# Altium footprint library PCBLIB.PcbLib: 557 footprints (part 20 of 36)
Each footprint in its own frame and in the unit in brackets; x right, y up, seen from the top. Pads: shape width x height; smd on the part's side, far side on the other; paste and mask are expansions set on the pad; w line width, h text height; cw(c..) or ccw(c..) is an arc to the next point about the centre after c.
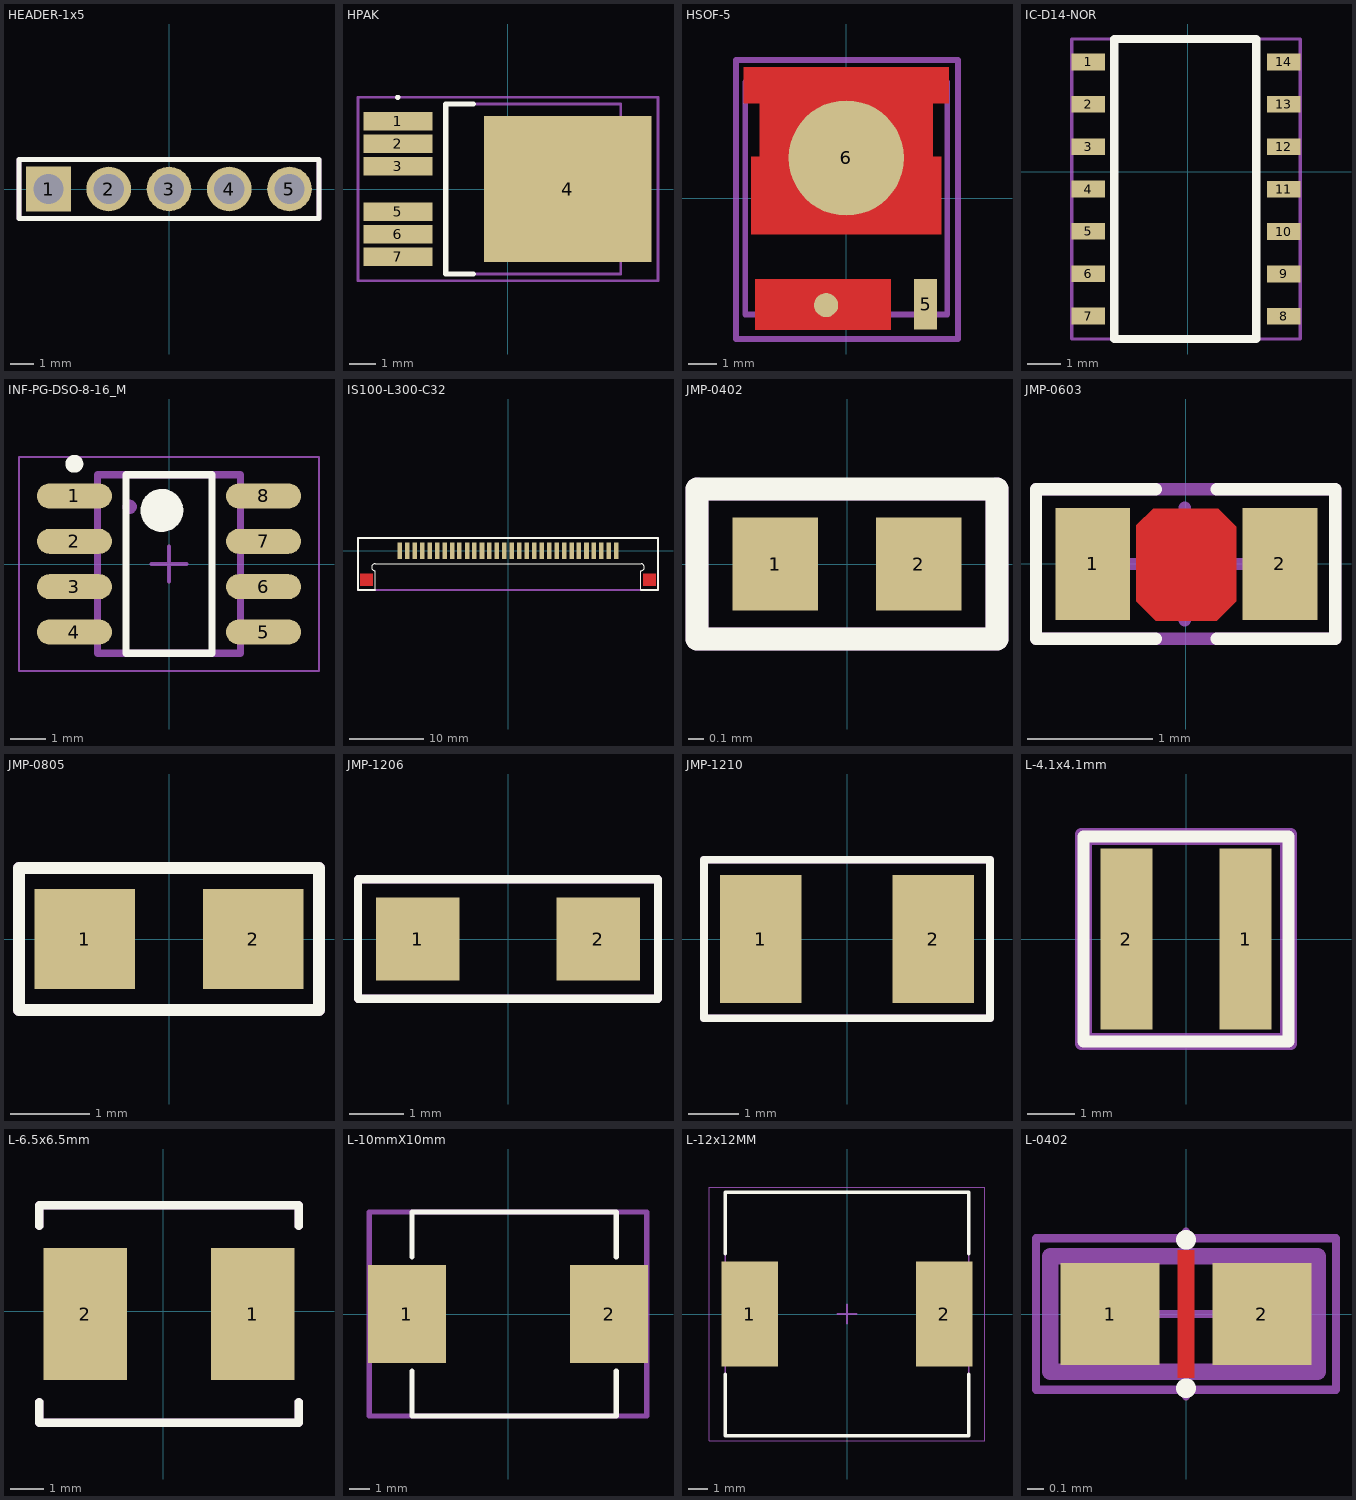
[diagram p19: the footprints below, top view; thin cyan lines are the x and y axes]

## HEADER-1x5 [mil]
pads (5):
  rect 74x74 hole 50 mask+2: 1(-200,0)
  round 74 hole 50 mask+2: 2(-100,0) 3(0,0) 4(100,0) 5(200,0)
Top Overlay:
  lines w8: -249,-49 -249,49 249,49 249,-49 -249,-49
ASM Top:
  lines w8: -249,-49 -249,49 249,49 249,-49 -249,-49
  text ".designator" at -74.8,-11.81 h31.5
3D body "Header_Male_5Pin.STEP": height 336.22, standoff -118.11, extent -250,-49 250,49.03

## HPAK [mm] "D-PAK, 7-Pads, Body 6.40x6.56mm (max), IPC Medium Density"
height 2.4
pads (7):
  rect 2.6x0.7 smd mask+0.05: 1(-4.15,2.55) 2(-4.15,1.7) 3(-4.15,0.85) 5(-4.15,-0.85) 6(-4.15,-1.7) 7(-4.15,-2.55)
  rect 6.3x5.5 smd mask+0.05: 4(2.25,0)
Top Overlay:
  circle w0.1: c-4.15,3.45 r0.05
  lines w0.2: -1.3,-3.2 -2.35,-3.2 -2.35,3.2 -1.3,3.2
Mechanical 15:
  lines w0.1: -0.5,0 0.5,0 ; 0,-0.5 0,0.5 ; -5.65,-3.45 5.65,-3.45 5.65,3.45 -5.65,3.45 -5.65,-3.45
ASM Top:
  lines w0.1: -2.35,-3.2 4.25,-3.2 4.25,3.2 -2.35,3.2 -2.35,-3.2
  text ".designator" at 0,0 h0.8
3D body "User Library-HPAK.step": height 2.41, standoff 0.01, extent -5.1,-3.3 4.7,3.3

## HSOF-5 [mm]
pads (3):
  round 0.837 smd paste-1000 mask+0: 1-2-3-4(-0.7,-3.7)
  rect 0.8x1.75 smd paste-0.05 mask+0: 5(2.75,-3.675)
  round 4 smd paste-1000 mask+0: 6(0,1.4)
Top Layer:
  region: -3.15,-2.81 1.55,-2.81 1.55,-4.55 -3.15,-4.55
  region: -3.55,4.55 3.55,4.55 3.55,3.3 3,3.3 3,1.45 3.3,1.45 3.3,-1.25 -3.3,-1.25 -3.3,1.45 -3,1.45 -3,3.3 -3.55,3.3
Top Paste:
  rectangle: 0.75,-4.5 1.45,-2.85
  rectangle: -0.55,-4.5 0.15,-2.85
  rectangle: -1.85,-4.5 -1.15,-2.85
  rectangle: -3.15,-4.5 -2.45,-2.85
  region: 3.2,-1.175 3.2,-0.175 0.2,-0.175 0.2,-1.175
  region: -0.2,-1.175 -0.2,-0.175 -3.2,-0.175 -3.2,-1.175
  region: 3.2,0.333 3.2,1.333 0.2,1.333 0.2,0.333
  region: -0.2,0.325 -0.2,1.325 -3.2,1.325 -3.2,0.325
  region: 2.9,1.9 2.9,2.9 0.2,2.9 0.2,1.9
  region: -0.2,1.9 -0.2,2.9 -2.9,2.9 -2.9,1.9
  region: -0.2,3.4 -0.2,4.4 -3.45,4.4 -3.45,3.4
  region: 3.45,3.4 3.45,4.4 0.2,4.4 0.2,3.4
Mechanical 15:
  lines w0.1: -0.5,0 0.5,0 ; 0,-0.5 0,0.5
  lines w0.2: -3.825,-4.875 -3.825,4.8 3.875,4.8 3.875,-4.875 -3.825,-4.875
ASM Top:
  lines w0.2: -3.5,-4.025 -3.5,4.038 3.5,4.038 3.5,-4.025 -3.5,-4.025
  text ".designator" at 0,-1.062 h0.8
3D body "User Library-PG-HSOF-5-1.step": height 2.31, standoff 0, extent -3.5,-4.025 3.5,3.975

## IC-D14-NOR [mm]
pads (14):
  rect 1x0.5 smd: 1(-2.99,3.3) 2(-2.99,2.028) 3(-2.99,0.757) 4(-2.99,-0.515) 5(-2.99,-1.787) 6(-2.99,-3.058) 7(-2.99,-4.33) 8(2.88,-4.34) 9(2.88,-3.067) 10(2.88,-1.793) 11(2.88,-0.52) 12(2.88,0.753) 13(2.88,2.027) 14(2.88,3.3)
Top Overlay:
  lines w0.254: -2.21,-5.02 2.057,-5.02 2.057,3.99 -2.21,3.99 -2.21,-5.02
ASM Top:
  lines w0.1: -2.315,3.99 3.38,3.99 3.38,-5.02 -3.49,-5.02 -3.49,3.99 -2.21,3.99
  text ".designator" at -0.305,-0.229 h0.8
3D body "D14.step": height 1.77, standoff 0.01, extent -3.139,-4.889 3.059,3.849

## INF-PG-DSO-8-16_M [mm] "SOP, 8-Leads, Body 4.9x3.9mm, Pitch 1.27mm, IPC Low Density"
height 1.75
pads (8):
  oval 2.1x0.7 smd: 1(-2.65,1.905) 2(-2.65,0.635) 3(-2.65,-0.635) 4(-2.65,-1.905) 5(2.65,-1.905) 6(2.65,-0.635) 7(2.65,0.635) 8(2.65,1.905)
Top Overlay:
  circle w0.25: c-2.65,2.805 r0.125
  circle w0.6: c-0.2,1.5 r0.3
  lines w0.2: -1.2,-2.5 -1.2,2.5 1.2,2.5 1.2,-2.5 -1.2,-2.5
Mechanical 15:
  lines w0.05: -4.2,-3 -4.2,3 4.2,3 4.2,-3 -4.2,-3
  lines w0.1: -0.5,0 0.5,0 ; 0,-0.5 0,0.5
ASM Top:
  circle w0.2: c-1.1,1.6 r0.1
  lines w0.2: -2,-2.5 2,-2.5 2,2.5 -2,2.5 -2,-2.5
  text ".designator" at -1.2,0 h0.8
3D body "SOIC-8-1.STEP": height 1.75, standoff 0, extent -3.012,-2.448 2.988,2.452

## IS100-L300-C32 [mil]
pads (32):
  rect 24x87 smd mask+2: 1(-571,0) 2(-531,0) 3(-492,0) 4(-452,0) 5(-452,0) 6(-413,0) 7(-374,0) 8(-334,0) 9(-295,0) 10(-256,0) 11(-216,0) 12(-177,0) 13(-137,0) 14(-98,0) 15(-59,0) 16(-19,0) 17(20,0) 18(59,0) 19(99,0) 20(138,0) 21(177,0) 22(217,0) 23(217,0) 24(256,0) 25(296,0) 26(335,0) 27(374,0) 28(414,0) 29(453,0) 30(492,0) 31(532,0) 32(571,0)
Top Layer:
  rectangle: 712,-186 780,-118
  rectangle: -780,-186 -712,-118
Top Overlay:
  lines w0.1: -700,-207 -700,-105 cw(c-700,-86) -700,-67 ; -699.91,-67.09 701.89,-67.09 cw(c700,-86) 700,-105 700,-207
  lines w10: -700,-207 -791,-207 -791,69 791,69 791,-207 714,-207 700,-207
Top Solder:
  rectangle: 710,-188 782,-116
  rectangle: -782,-188 -710,-116
ASM Top:
  lines w10: -791,-207 -791,69 791,69 791,-207 -791,-207
  text ".designator" at -331,-124 h31.5

## JMP-0402 [mm]
pads (3):
  rect 0.57x0.62 smd mask+0.05: 1(-0.48,0) 2(0.48,0)
  rect 0.57x0.62 smd mask+0: 1(-0.48,0)
Top Overlay:
  lines w0.152: -1,-0.5 -1,0.5 1,0.5 1,-0.5 -1,-0.5
ASM Top:
  lines w0.15: -1,0.5 1,0.5
  lines w0.152: -1,0.5 -1,-0.5 1,-0.5 1,0.5
  text ".designator" at -0.011,-0.078 h0.8
3D body "R_0402.step": height 0.41, standoff 0.01, extent -0.546,-0.275 0.524,0.275

## JMP-0603 [mm]
pads (2):
  rect 0.6x0.9 smd: 1(-0.744,0) 2(0.756,0)
Top Layer:
  pour cut-out: -0.262,0.444 -0.394,0.311 -0.394,-0.3 -0.238,-0.456 0.249,-0.456 0.406,-0.3 0.406,0.3 0.262,0.444
Top Overlay:
  lines w0.1: -0.238,-0.6 -1.2,-0.6 -1.2,0.6 -0.238,0.6 ; 0.249,-0.6 1.2,-0.6 1.2,0.6 0.249,0.6
Mechanical 15:
  lines w0.1: -0.45,0 0.45,0 ; -0.006,-0.45 -0.006,0.45
ASM Top:
  lines w0.1: -1.2,-0.6 -1.2,0.6 1.2,0.6 1.2,-0.6 -1.2,-0.6
  text ".designator" at -0.33,-0.178 h0.8
3D body: height 0.25, standoff 0, extent 0.025,0.229 0.025,0.229
3D body "R_0603.step": height 0.46, standoff 0.01, extent -0.775,-0.425 0.775,0.425

## JMP-0805 [mil]
pads (2):
  rect 50x50 smd mask+1.97: 1(-42,0) 2(42,0)
Top Overlay:
  lines w6: -74.8,-35.43 74.8,-35.43 74.8,35.43 -74.8,35.43 -74.8,-35.43
ASM Top:
  lines w6: -74.8,-35.43 -74.8,35.43 74.8,35.43 74.8,-35.43 -74.8,-35.43
  text ".designator" at -61,-19 h31.5
3D body "R_0805.step": height 20.18, standoff 0.5, extent -40.36,-24.6 38.38,24.61

## JMP-1206 [mil]
pads (2):
  rect 60x60 smd mask+0: 1(-65,0) 2(65,0)
Top Overlay:
  lines w6: -108,-43 -108,43 108,43 108,-43 -108,-43
Top 3D Body:
  lines w6: -108,42 -108,-43 108,-43 108,43 -108,43
ASM Top:
  lines w6: -108,-43 -108,43 108,43 108,-43 -108,-43
  text ".designator" at -88,-22 h31.5
3D body "R_1206.step": height 22.15, standoff 0.5, extent -57.99,-31.49 68,31.5

## JMP-1210 [mil]
pads (2):
  rect 64x100 smd mask+0: 1(-67.5,0) 2(67.5,0)
Top Overlay:
  lines w6: -112,-62 -112,62 112,62 112,-62 -112,-62
ASM Top:
  lines w6: -112,-62 -112,62 112,62 112,-62 -112,-62
  text ".designator" at -95,-45 h31.5
3D body "R_1210.step": height 22.16, standoff 0.5, extent -62.99,-49.42 63,49

## L-4.1x4.1mm [mm] "SRP4020FA-2R2M"
height 2.1
pads (2):
  rect 1.1x3.8 smd mask+0.05: 1(1.25,0) 2(-1.25,0)
Top Overlay:
  lines w0.254: -2.15,-2.15 -2.15,2.15 2.15,2.15 2.15,-2.15 -2.15,-2.15
Mechanical 15:
  lines w0.254: -2.2,-2.2 2.2,-2.2 2.2,2.2 -2.1,2.2 -2.2,2.2 -2.2,-2.2
ASM Top:
  lines w0.254: -2.1,-2.1 -2.1,2.1 2.1,2.1 2.1,-2.1 -2.1,-2.1
  text ".designator" at -1.6,-0.4 h0.8
3D body "SRP4020FA.stp": height 1.91, standoff 0, extent -2.05,-2.05 2.05,2.05

## L-6.5x6.5mm [mil]
pads (2):
  rect 100x158 smd mask+1.97: 1(107,-3) 2(-93,-3)
Top Overlay:
  lines w10: -148,-108 -148,-133 162,-133 162,-108 ; -148,102 -148,127 162,127 162,102
ASM Top:
  lines w10: -148,-108 -148,-133 162,-133 162,-108 ; -148,102 -148,127 162,127 162,102
  text ".designator" at -43,-7.94 h31.5
3D body "srr0603.stp": height 130.42, standoff 0.5, extent -120.9,-130 135,125.9

## L-10mmX10mm [mm]
height 4.5
pads (2):
  rect 3.8x4.8 smd: 1(-4.95,0) 2(4.95,0)
Top Overlay:
  lines w0.254: -4.7,-2.8 -4.7,-5 5.3,-5 5.3,-2.8 ; -4.7,2.8 -4.7,5 5.3,5 5.3,2.8
ASM Top:
  lines w0.254: -6.8,-4.962 -6.762,-5 6.8,-5 6.8,5 -6.8,5 -6.8,-5 -6.8,-4.924
  text ".designator" at -1,-0.3 h0.8
3D body "7447714015_Download_STP_WE-PD-1050_rev1.stp": height 4.76, standoff -0.04, extent -4.7,-5 5.3,5

## L-12x12MM [mm] "Precision Wire Wound Inductor, 2-Leads, Body 12.00x12.00mm, IPC Medium Density"
height 6
pads (2):
  rect 2.9x5.4 smd: 1(-5,0) 2(5,0)
Top Overlay:
  lines w0.2: -6.25,-3.1 -6.25,-6.25 6.25,-6.25 6.25,-3.1 ; -6.25,3.1 -6.25,6.25 6.25,6.25 6.25,3.1
Mechanical 15:
  lines w0.05: -7.075,-6.5 -7.075,6.5 7.075,6.5 7.075,-6.5 -7.075,-6.5
  lines w0.1: -0.5,0 0.5,0 ; 0,-0.5 0,0.5
ASM Top:
  lines w0.1: -6.25,-6.25 -6.25,6.25 6.25,6.25 6.25,-6.25 -6.25,-6.25
  text ".designator" at -1.662,-0.2 h0.8
3D body "L-12x12MM.step": height 6.1, standoff 0, extent -6.1,-6 6.1,6

## L-0402 [mm]
pads (2):
  rect 0.6x0.62 smd: 1(-0.46,0) 2(0.46,0)
Top Layer:
  pour cut-out: -0.05,0.388 -0.05,-0.387 0.05,-0.388 0.05,0.387
Top Overlay:
  circle w0.1: c0,0.45 r0.01
  circle w0.1: c0,-0.45 r0.01
Mechanical 15:
  lines w0.05: -0.5,0 0.5,0 ; 0,-0.5 0,0.5 ; -0.91,-0.46 -0.91,0.46 0.91,0.46 0.91,-0.46 -0.91,-0.46
ASM Top:
  lines w0.1: -0.825,-0.35 -0.825,0.35 0.8,0.35 0.8,-0.35 -0.825,-0.35
  text ".designator" at -0.5,-0.2 h0.8
3D body "INDC1005X60N EIA 0402.step": height 0.51, standoff 0.01, extent -0.475,-0.305 0.525,0.295